# Altium footprint library CADTchip.PcbLib: 195 footprints (part 13 of 13)
Each footprint in its own frame and in the unit in brackets; x right, y up, seen from the top. Pads: shape width x height; smd on the part's side, far side on the other; paste and mask are expansions set on the pad; w line width, h text height; cw(c..) or ccw(c..) is an arc to the next point about the centre after c.
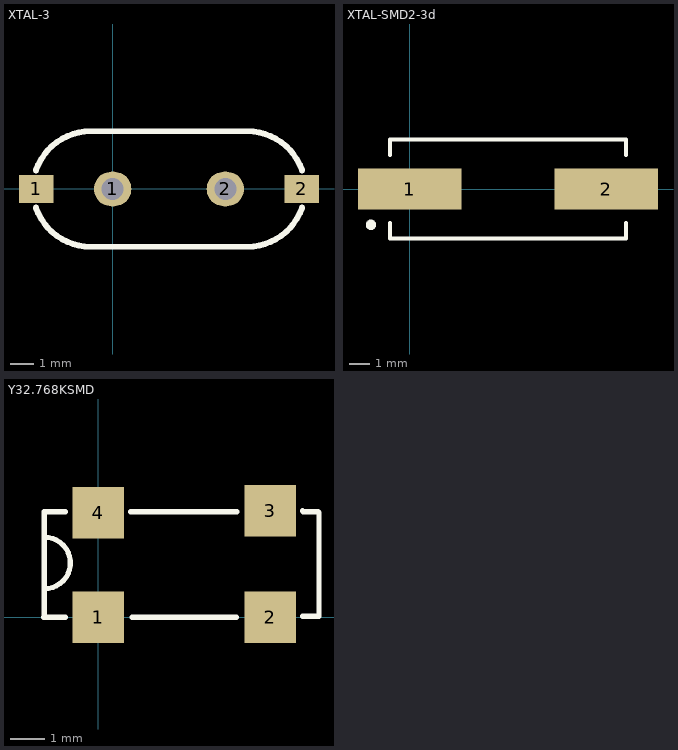
[diagram p12: the footprints below, top view; thin cyan lines are the x and y axes]

## XTAL-3 [mm]
pads (4):
  rect 1.5x1.2 smd: 1(-3.31,0) 2(8.19,0)
  oval 1.62x1.5 hole 0.95: 1(0,0) 2(4.88,0)
Top Overlay:
  lines w0.254: -3.325,-0.809 ccw(c-0.96,0) -0.96,-2.5 ; -3.325,0.809 cw(c-0.96,0) -0.96,2.5 5.84,2.5 cw(c5.84,0) 8.205,0.809 ; -0.965,-2.5 5.84,-2.5 ccw(c5.84,0) 8.205,-0.809
3D body: height 3.5, standoff -3, extent -2.95,-2.255 7.85,2.245

## XTAL-SMD2-3d [mm]
pads (2):
  rect 5x2 smd: 1(0,0) 2(9.5,0)
Top Overlay:
  circle w0.25: c-1.875,-1.73 r0.125
  lines w0.2: -0.95,-1.65 -0.95,-2.4 10.45,-2.4 10.45,-1.65 ; -0.95,1.65 -0.95,2.4 10.45,2.4 10.45,1.65
3D body: height 4, standoff 0, extent -1.95,-2.462 11.45,2.438

## Y32.768KSMD [mm]
pads (4):
  rect 1.5x1.5 smd: 1(0,0) 2(5.003,0) 3(5.003,3.098) 4(0,3.048)
Top Overlay:
  lines w0.152: -1.581,0.831 ccw(c-1.562,1.58) -1.581,2.329 ; -0.966,0 -1.601,0 -1.575,0.025 -1.575,3.073 -0.966,3.073 ; 0.939,3.073 4.038,3.073 ; 0.99,0 4.013,0 ; 5.943,0.025 6.426,0.025 6.426,3.048 6.4,3.073 5.969,3.073 5.943,3.098